# Altium footprint library Regular_Components.PcbLib: 42 footprints (part 2 of 3)
Each footprint in its own frame and in the unit in brackets; x right, y up, seen from the top. Pads: shape width x height; smd on the part's side, far side on the other; paste and mask are expansions set on the pad; w line width, h text height; cw(c..) or ccw(c..) is an arc to the next point about the centre after c.
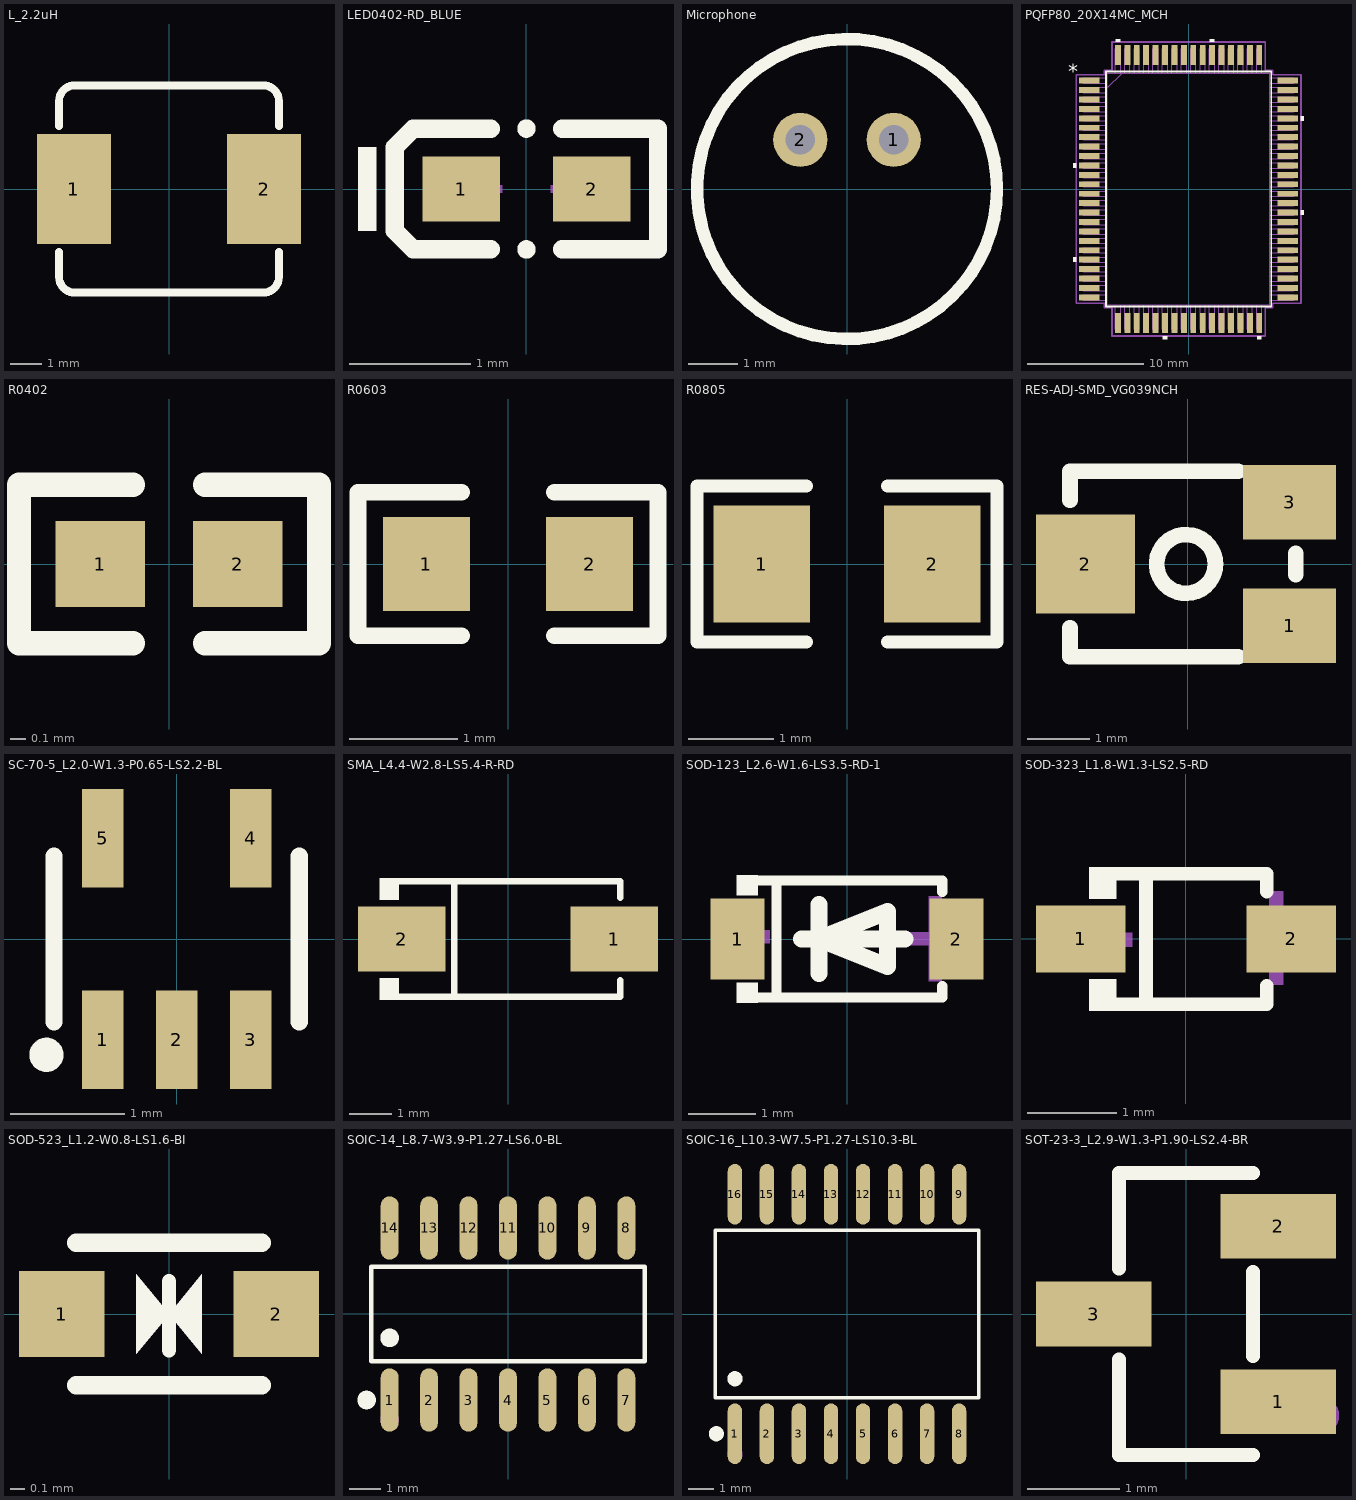
[diagram p1: the footprints below, top view; thin cyan lines are the x and y axes]

## L_2.2uH [mm]
pads (2):
  rect 2.35x3.5 smd: 1(-3.025,0) 2(3.025,0)
Top Overlay:
  lines w0.254: -3.5,-2 -3.5,-2.8 ccw(c-3,-2.8) -3,-3.3 3,-3.3 ccw(c3,-2.8) 3.5,-2.8 3.5,-2 ; -3.5,2 -3.5,2.8 cw(c-3,2.8) -3,3.3 3,3.3 cw(c3,2.8) 3.5,2.8 3.5,2
3D body "Inductor.STEP": height 3, standoff 0, extent -3.5,-3.3 3.5,3.3

## LED0402-RD_BLUE [mm]
pads (2):
  rect 0.636x0.54 smd: 1(-0.538,0) 2(0.538,0)
Top Overlay:
  circle w0.076: c0,0.499 r0.038
  circle w0.076: c0,-0.499 r0.038
  region: -1.237,-0.346 -1.237,0.346 -1.39,0.346 -1.39,-0.346
  lines w0.152: -0.296,-0.499 -0.933,-0.499 -1.085,-0.346 -1.085,0.346 -0.933,0.499 -0.296,0.499 ; 0.296,-0.499 1.085,-0.499 1.085,0.499 0.296,0.499
Top Paste:
  region: -0.198,-0.23 -0.198,0.23 -0.238,0.27 -0.816,0.27 -0.856,0.23 -0.856,-0.23 -0.816,-0.27 -0.238,-0.27
  region: 0.198,-0.23 0.198,0.23 0.238,0.27 0.816,0.27 0.856,0.23 0.856,-0.23 0.816,-0.27 0.238,-0.27
Mechanical 15:
  region: 0.35,-0.2 0.35,0.2 0.29,0.2 0.29,-0.2
  region: 0.44,-0.03 0.44,0.03 0.2,0.03 0.2,-0.03
  region: -0.44,-0.03 -0.44,0.03 -0.2,0.03 -0.2,-0.03
3D body "LED0402-RD_BLUE.STEP": height 0.21, standoff 0, extent -0.51,-0.25 0.51,0.26

## Microphone [mm]
pads (2):
  round 1.1 hole 0.6: 1(0.95,1) 2(-0.95,1)
Top Overlay:
  circle w0.254: c0,0 r3.05

## PQFP80_20X14MC_MCH [mil]
pads (80):
  rect 68.56x19.97 smd paste+0 mask+0: 1(-337,368) 2(-337,336) 3(-337,304) 4(-337,272) 5(-337,240) 6(-337,208) 7(-337,176) 8(-337,144) 9(-337,112) 10(-337,80) 11(-337,48) 12(-337,16) 13(-337,-16) 14(-337,-48) 15(-337,-80) 16(-337,-112) 17(-337,-144) 18(-337,-176) 19(-337,-208) 20(-337,-240) 21(-337,-272) 22(-337,-304) 23(-337,-336) 24(-337,-368) 41(337,-368) 42(337,-336) 43(337,-304) 44(337,-272) 45(337,-240) 46(337,-208) 47(337,-176) 48(337,-144) 49(337,-112) 50(337,-80) 51(337,-48) 52(337,-16) 53(337,16) 54(337,48) 55(337,80) 56(337,112) 57(337,144) 58(337,176) 59(337,208) 60(337,240) 61(337,272) 62(337,304) 63(337,336) 64(337,368)
  rect 19.97x68.56 smd paste+0 mask+0: 25(-240,-455) 26(-208,-455) 27(-176,-455) 28(-144,-455) 29(-112,-455) 30(-80,-455) 31(-48,-455) 32(-16,-455) 33(16,-455) 34(48,-455) 35(80,-455) 36(112,-455) 37(144,-455) 38(176,-455) 39(208,-455) 40(240,-455) 65(240,455) 66(208,455) 67(176,455) 68(144,455) 69(112,455) 70(80,455) 71(48,455) 72(16,455) 73(-16,455) 74(-48,455) 75(-80,455) 76(-112,455) 77(-144,455) 78(-176,455) 79(-208,455) 80(-240,455)
Top Overlay:
  region: -381.28,87.5 -391.28,87.5 -391.28,72.5 -381.28,72.5
  region: -381.28,-232.5 -391.28,-232.5 -391.28,-247.5 -381.28,-247.5
  region: -72.5,-499.28 -87.5,-499.28 -87.5,-509.28 -72.5,-509.28
  region: 247.5,-499.28 232.5,-499.28 232.5,-509.28 247.5,-509.28
  region: 381.28,-72.5 391.28,-72.5 391.28,-87.5 381.28,-87.5
  region: 381.28,247.5 391.28,247.5 391.28,232.5 381.28,232.5
  region: 87.5,499.28 72.5,499.28 72.5,509.28 87.5,509.28
  region: -232.5,499.28 -247.5,499.28 -247.5,509.28 -232.5,509.28
  lines w6: -280.5,-398.5 -280.5,398.5 280.5,398.5 280.5,-398.5 -280.5,-398.5
  text "*" at -408.78,374 h50
Mechanical 13:
  drawing of 325 lines, arcs and shapes, not listed
  text "*" at -273,359 h50
Mechanical 15:
  lines w6: -381.28,-387.98 -285.5,-387.98 -285.5,-403.5 -259.98,-403.5 -259.98,-499.28 259.98,-499.28 259.98,-403.5 285.5,-403.5 285.5,-387.98 381.28,-387.98 381.28,387.98 285.5,387.98 285.5,403.5 259.98,403.5 259.98,499.28 -259.98,499.28 -259.98,403.5 -285.5,403.5 -285.5,387.98 -381.28,387.98 -381.28,-387.98
3D body "PQFP80_20X14MC_MCH.step": height 134.09, standoff 0, extent -357.52,-475.51 357.52,475.51

## R0402 [mm]
pads (2):
  rect 0.566x0.54 smd: 1(-0.433,0) 2(0.433,0)
Top Overlay:
  lines w0.152: -0.226,-0.499 -0.944,-0.499 -0.944,0.499 -0.226,0.499 ; 0.226,-0.499 0.944,-0.499 0.944,0.499 0.226,0.499
Top Paste:
  region: 0.135,-0.23 0.135,0.23 0.175,0.27 0.676,0.27 0.716,0.23 0.716,-0.23 0.676,-0.27 0.175,-0.27
  region: -0.135,-0.23 -0.135,0.23 -0.175,0.27 -0.676,0.27 -0.716,0.23 -0.716,-0.23 -0.676,-0.27 -0.175,-0.27
3D body "R0402.STEP": height 0.5, standoff 0, extent -0.5,-0.25 0.5,0.25

## R0603 [mil]
pads (2):
  rect 31.75x34.02 smd: 1(-29.66,0) 2(29.66,0)
Top Overlay:
  lines w6: -16.78,-26.01 -54.53,-26.01 -54.53,26.01 -16.78,26.01 ; 16.78,-26.01 54.53,-26.01 54.53,26.01 16.78,26.01
Top Paste:
  region: 47.05,17.72 15.55,17.72 13.58,15.75 13.58,6.77 28.15,6.77 28.15,-6.22 13.58,-6.22 13.58,-15.75 15.55,-17.72 47.05,-17.72 49.02,-15.75 49.02,15.75
  region: -13.98,15.75 -13.98,6.77 -28.94,6.77 -28.94,-6.22 -13.98,-6.22 -13.98,-15.75 -15.94,-17.72 -47.05,-17.72 -49.02,-15.75 -49.02,15.75 -47.05,17.72 -15.94,17.72
3D body "R0603.STEP": height 31.5, standoff 0, extent -31.5,-15.75 31.5,15.75

## R0805 [mil]
pads (2):
  rect 44.59x54.21 smd: 1(-39.37,0) 2(39.37,0)
Top Overlay:
  lines w6: -18.75,-36.11 -69.34,-36.11 -69.34,36.11 -18.75,36.11 ; 18.75,-36.11 69.34,-36.11 69.34,36.11 18.75,36.11
Top Paste:
  region: -66.93,-25.2 -66.93,25.2 -64.96,27.16 -19.68,27.16 -17.72,25.2 -17.52,9.05 -35.24,9.05 -35.24,-8.66 -17.91,-8.66 -17.72,-25.2 -19.68,-27.17 -64.96,-27.17
  region: 17.72,-25.2 17.72,-8.66 35.24,-8.66 35.24,9.05 17.91,9.05 17.72,25.2 19.68,27.16 64.96,27.16 66.93,25.2 66.93,-25.2 64.96,-27.17 19.68,-27.17
3D body "R0805.STEP": height 24.02, standoff 0, extent -39.37,-25.59 39.37,25.63

## RES-ADJ-SMD_VG039NCH [mm]
pads (3):
  rect 1.5x1.2 smd: 1(1.65,-1) 3(1.65,1)
  rect 1.6x1.6 smd: 2(-1.65,0)
Top Overlay:
  circle w0.254: c-0.025,0 r0.475
  lines w0.254: -0.1,1.5 -1.9,1.5 ; 0.819,-1.5 -0.1,-1.5 -1.9,-1.5 ; 0.819,1.5 -1.9,1.5 ; 1.75,-0.169 1.75,0.169 ; -1.9,-1.5 -1.9,-1.031 ; -1.9,-1.5 -1.9,-1.031 ; -1.9,-1.5 -1.9,-1.031 ; -1.9,1.031 -1.9,1.5 ; -1.9,1.031 -1.9,1.5 ; -1.9,1.031 -1.9,1.5
Mechanical 15:
  circle w0.2: c2.1,-1.2 r0.1

## SC-70-5_L2.0-W1.3-P0.65-LS2.2-BL [mm]
pads (5):
  rect 0.364x0.866 smd: 1(-0.65,-0.883) 2(0,-0.883) 3(0.65,-0.883) 4(0.65,0.883) 5(-0.65,0.883)
Top Overlay:
  circle w0.15: c-1.143,-1.016 r0.075
  lines w0.152: -1.076,-0.726 -1.076,0.726 ; 1.076,-0.726 1.076,0.726
Mechanical 15:
  circle w0.15: c-0.635,-0.889 r0.075

## SMA_L4.4-W2.8-LS5.4-R-RD [mil]
pads (2):
  rect 81.2x60.59 smd: 1(98.57,0) 2(-98.57,0)
Top Overlay:
  region: -101.18,56.39 -101.18,36.3 -119.18,36.3 -119.18,56.39
  region: -101.18,-56.39 -101.18,-36.3 -119.18,-36.3 -119.18,-56.39
  lines w6: -104.18,-53.39 104.18,-53.39 104.18,-38.3 ; -104.18,53.39 104.18,53.39 104.18,38.3 ; -49.97,-53.39 -49.97,53.39
Mechanical 15:
  region: -93.62,-3.78 -93.62,3.78 -63.39,3.78 -63.39,-3.78
  region: 93.62,-3.78 93.62,3.78 63.39,3.78 63.39,-3.78
  region: 82.28,-25.2 82.28,25.2 74.72,25.2 74.72,-25.2
3D body "SMA_L4.4-W2.8-LS5.4-R-RD.STEP": height 82.68, standoff 0, extent -102.36,-55.12 102.36,55.12

## SOD-123_L2.6-W1.6-LS3.5-RD-1 [mm]
pads (2):
  rect 0.8x1.2 smd: 1(-1.621,0) 2(1.621,0)
Top Overlay:
  region: -1.325,-0.942 -1.325,-0.647 -1.63,-0.647 -1.63,-0.942
  region: -1.325,0.942 -1.325,0.647 -1.63,0.647 -1.63,0.942
  lines w0.152: -1.401,-0.866 1.411,-0.866 1.411,-0.698 ; -1.401,0.866 1.411,0.866 1.411,0.698 ; -1.044,-0.866 -1.044,0.866
  lines w0.254: -0.669,0 0.855,0 ; -0.415,-0.508 -0.415,0.508 ; -0.415,0 0.601,-0.406 0.601,0.406 -0.415,0
Mechanical 15:
  region: 1.402,0.635 1.402,-0.629 1.212,-0.629 1.212,0.635
  region: 1.686,0.098 1.686,-0.092 0.928,-0.092 0.928,0.098
  region: -1.9,0.127 -1.9,-0.063 -1.142,-0.063 -1.142,0.127

## SOD-323_L1.8-W1.3-LS2.5-RD [mm]
pads (2):
  rect 1x0.75 smd: 1(-1.173,0) 2(1.173,0)
Top Overlay:
  region: -0.775,0.802 -0.775,0.45 -1.08,0.45 -1.08,0.802
  region: -0.775,-0.802 -0.775,-0.45 -1.08,-0.45 -1.08,-0.802
  lines w0.152: -0.851,-0.726 0.901,-0.726 0.901,-0.52 ; -0.851,0.726 0.901,0.726 0.901,0.53 ; -0.447,-0.726 -0.447,0.726
Mechanical 15:
  region: -1.225,0.07 -1.225,-0.086 -0.601,-0.086 -0.601,0.07
  region: 1.315,0.09 1.315,-0.066 0.691,-0.066 0.691,0.09
  region: 1.083,0.53 1.083,-0.51 0.927,-0.51 0.927,0.53
3D body "SOD-323_L1.8-W1.3-LS2.5-RD.STEP": height 1.2, standoff 0, extent -1.231,-0.65 1.281,0.65

## SOD-523_L1.2-W0.8-LS1.6-BI [mm]
pads (2):
  rect 0.6x0.6 smd: 1(-0.75,0) 2(0.75,0)
Top Overlay:
  region: 0,0 -0.229,-0.279 -0.229,0.279
  region: 0,0 0.229,0.279 0.229,-0.279
  lines w0.1: 0,-0.254 0,0.229
  lines w0.13: -0.65,-0.5 0.65,-0.5 ; -0.65,0.5 0.65,0.5
Mechanical 15:
  region: 0.229,0.279 0.229,-0.279 0,0
  region: -0.229,0.279 -0.229,-0.279 0,0
3D body "SOD-523_L1.2-W0.8-LS1.6-BI.STEP": height 0.71, standoff 0, extent -0.8,-0.4 0.8,0.4

## SOIC-14_L8.7-W3.9-P1.27-LS6.0-BL [mil]
pads (14):
  oval 22.6x80.24 smd: 1(-150,-109.02) 2(-100,-109.02) 3(-50,-109.02) 4(0,-109.02) 5(50,-109.02) 6(100,-109.02) 7(150,-109.02) 8(150,109.02) 9(100,109.02) 10(50,109.02) 11(0,109.02) 12(-50,109.02) 13(-100,109.02) 14(-150,109.02)
Top Overlay:
  circle w11.81: c-179.11,-109.02 r5.91
  circle w11.81: c-150,-30.28 r5.91
  lines w6: -173.28,-59.9 173.28,-59.9 173.28,59.9 -173.28,59.9 -173.28,-59.9
Mechanical 15:
  circle w11.81: c-150,-133.86 r5.91
3D body "SOIC-14_L8.7-W3.9-P1.27-LS6.0-BL.STEP": height 78.68, standoff 0, extent -169.12,-118.11 169.12,118.11

## SOIC-16_L10.3-W7.5-P1.27-LS10.3-BL [mil]
pads (16):
  oval 22.6x94.51 smd: 1(-175,-187.02) 2(-125,-187.02) 3(-75,-187.02) 4(-25,-187.02) 5(25,-187.02) 6(75,-187.02) 7(125,-187.02) 8(175,-187.02) 9(175,187.02) 10(125,187.02) 11(75,187.02) 12(25,187.02) 13(-25,187.02) 14(-75,187.02) 15(-125,187.02) 16(-175,187.02)
Top Overlay:
  circle w11.81: c-204.11,-187.02 r5.91
  circle w11.81: c-175,-101.14 r5.91
  lines w6: -205.76,-130.76 205.76,-130.76 205.76,130.76 -205.76,130.76 -205.76,-130.76
Mechanical 15:
  circle w11.81: c-175,-219 r5.91
3D body "SOIC-16_L10.3-W7.5-P1.27-LS10.3-BL.STEP": height 112.22, standoff 0, extent -202.76,-204.84 202.76,204.84

## SOT-23-3_L2.9-W1.3-P1.90-LS2.4-BR [mm]
pads (3):
  rect 1.25x0.7 smd: 1(1,-0.95) 2(1,0.95) 3(-1,0)
Top Overlay:
  lines w0.152: -0.726,-0.495 -0.726,-1.526 0.726,-1.526 ; -0.726,0.495 -0.726,1.526 0.726,1.526 ; 0.726,-0.455 0.726,0.455
Mechanical 15:
  circle w0.2: c1.46,-1.1 r0.1
3D body "SOT-23-3_L2.9-W1.3-P1.90-LS2.4-BR.STEP": height 1.05, standoff 0, extent -1.25,-1.447 1.25,1.447